# Altium footprint library Connector.PcbLib: 231 footprints (part 5 of 15)
Each footprint in its own frame and in the unit in brackets; x right, y up, seen from the top. Pads: shape width x height; smd on the part's side, far side on the other; paste and mask are expansions set on the pad; w line width, h text height; cw(c..) or ccw(c..) is an arc to the next point about the centre after c.
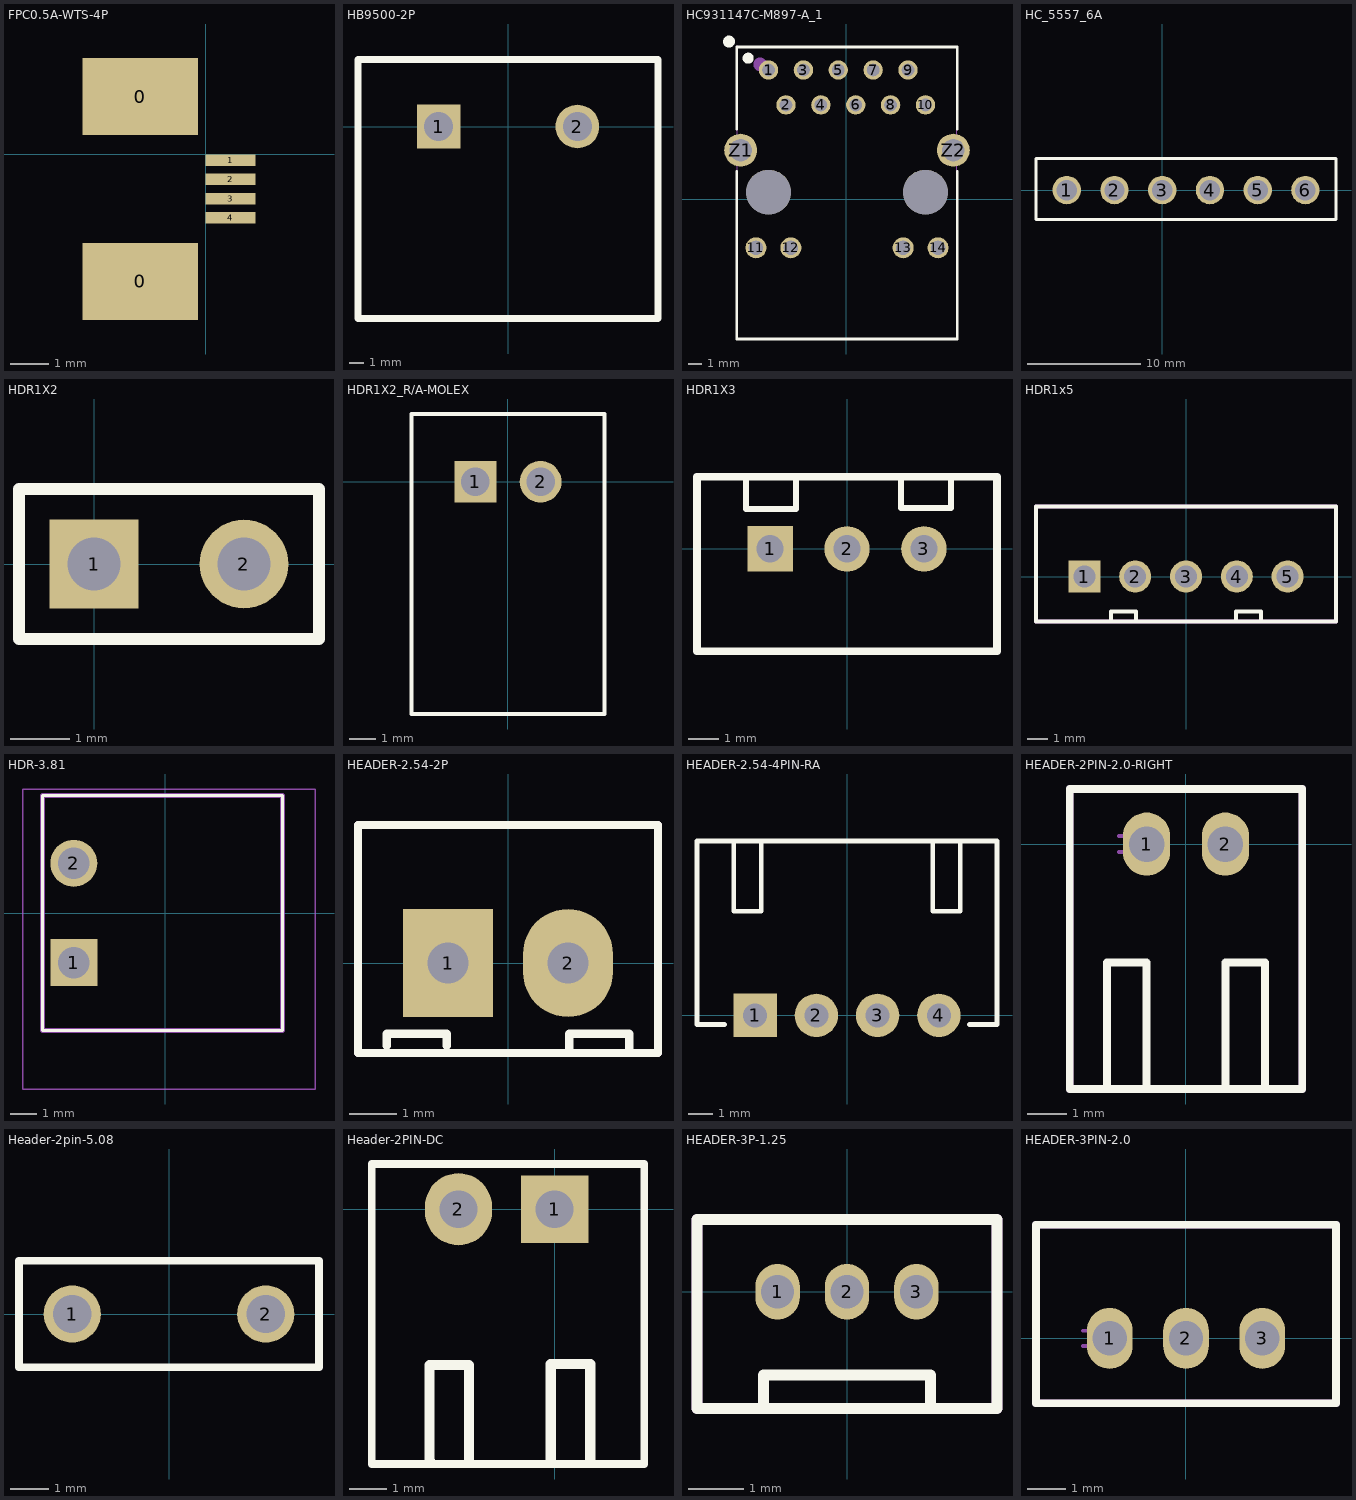
[diagram p4: the footprints below, top view; thin cyan lines are the x and y axes]

## FPC0.5A-WTS-4P [mm]
pads (6):
  rect 3x2 smd: 0(-1.7,-3.3) 0(-1.7,1.5)
  rect 1.3x0.3 smd: 1(0.65,-0.15) 2(0.65,-0.65) 3(0.65,-1.15) 4(0.65,-1.65)

## HB9500-2P [mm] "CONN BARRIER STRIP 2CIRC 0.375\""
pads (2):
  rect 3x3 hole 2: 1(-4.765,0)
  round 3 hole 2: 2(4.765,0)
Top Overlay:
  lines w0.5: -10.3,-13.18 -10.3,4.6 10.3,4.6 10.3,-13.18 -10.3,-13.18
Mechanical 1:
  lines w0.25: -10.3,4.6 10.259,4.6
Mechanical 13:
  lines w0.25: -10.3,4.6 -10.3,4.6 ; -10.3,4.6 -10.3,-13.18 10.3,-13.18 10.3,4.6 10.287,4.587 10.287,4.572 ; -10.3,4.6 10.259,4.6 ; 10.259,4.6 10.287,4.572 ; 10.259,4.6 10.287,4.572
  text ".Designator" at -5,-4 h2
Mechanical 15:
  lines w0.25: -10.3,-13.18 10.3,-13.18 10.3,4.6 -10.3,4.6 -10.3,-13.18
  text ".Comment" at -5,-4 h2
3D body "c-3-1437652-9-p-3d.stp": height 15.91, standoff -5.04, extent -10.3,-13.18 10.3,4.6

## HC931147C-M897-A_1 [mm]
pads (18):
  round 1.408 hole 0.9 slot 0.9 at 0 deg paste+0 mask+0.05: 1(-5.66,9.426) 2(-4.39,6.886) 3(-3.12,9.426) 4(-1.85,6.886) 5(-0.58,9.426) 6(0.69,6.886) 7(1.96,9.426) 8(3.23,6.886) 9(4.5,9.426) 10(5.77,6.886)
  round 1.53 hole 1.02 slot 1.025 at 0 deg paste+0 mask+0.05: 11(-6.575,-3.524) 12(-4.035,-3.524) 13(4.145,-3.524) 14(6.685,-3.524)
  round 2.4 hole 1.6 paste+0 mask+0.05: Z1(-7.69,3.586) Z2(7.8,3.586)
  round 3.25 hole 3.25 unplated: ""(-5.66,0.536) ""(5.77,0.536)
Top Overlay:
  circle w0.5: c-8.539,11.5 r0.186
  lines w0.2: -7.984,2.037 -7.984,-10.16 8.094,-10.16 8.094,2.037 ; -7.984,5.136 -7.984,11.102 8.094,11.102 8.094,5.136
  lines w0.4: -6.945,10.272 cw(c-7.145,10.285) -7.344,10.297 cw(c-7.145,10.285) -6.945,10.276
Mechanical 6:
  circle w0.5: c-6.266,9.837 r0.25
Mechanical 15:
  region: -5.41,9.276 -5.91,9.276 -5.91,9.576 -5.41,9.576
  region: 4.75,9.276 4.25,9.276 4.25,9.576 4.75,9.576
  region: 2.21,9.276 1.71,9.276 1.71,9.576 2.21,9.576
  region: -0.33,9.276 -0.83,9.276 -0.83,9.576 -0.33,9.576
  region: -2.87,9.276 -3.37,9.276 -3.37,9.576 -2.87,9.576
  region: -7.885,11.136 -7.885,11.161 -7.92,11.196 -7.97,11.196 -8.005,11.161 -8.005,11.136 -8.005,11.111 -7.97,11.076 -7.92,11.076 -7.885,11.111
  region: -1.6,6.736 -2.1,6.736 -2.1,7.036 -1.6,7.036
  region: 0.94,6.736 0.44,6.736 0.44,7.036 0.94,7.036
  region: 3.48,6.736 2.98,6.736 2.98,7.036 3.48,7.036
  region: 6.02,6.736 5.52,6.736 5.52,7.036 6.02,7.036
  region: 7.925,4.186 7.925,2.986 7.675,2.986 7.675,4.186
  region: -7.565,4.186 -7.565,2.986 -7.815,2.986 -7.815,4.186
  region: -3.785,-3.774 -4.285,-3.774 -4.285,-3.274 -3.785,-3.274
  region: 4.395,-3.774 3.895,-3.774 3.895,-3.274 4.395,-3.274
  region: -6.325,-3.774 -6.825,-3.774 -6.825,-3.274 -6.325,-3.274
  region: 6.935,-3.774 6.435,-3.774 6.435,-3.274 6.935,-3.274
  region: -4.14,6.736 -4.64,6.736 -4.64,7.036 -4.14,7.036
  lines w0.051: -7.945,-10.164 -7.945,11.136 8.055,11.136 8.055,-10.164 -7.945,-10.164
3D body "step_temp.STEP": height 13.5, standoff -3.05, extent -8.034,-10.364 8.006,10.936

## HC_5557_6A [mm]
pads (6):
  round 2.5 hole 1.8: 1(-8.4,0) 2(-4.2,0) 3(0,0) 4(4.2,0) 5(8.4,0) 6(12.6,0)
Top Overlay:
  lines w0.254: -11.108,-2.606 -11.108,2.794 15.292,2.794 15.292,-2.606 -11.108,-2.606
3D body "3D.step": height 13.2, standoff -3.4, extent -11.244,-3.759 15.156,2.951

## HDR1X2 [mm] "Connector; Header; 2 Position"
pads (2):
  rect 1.5x1.5 hole 0.9: 1(0,0)
  round 1.5 hole 0.9: 2(2.54,0)
Top Overlay:
  lines w0.2: -1.27,-1.27 -1.27,1.27 3.81,1.27 3.81,-1.27 -1.27,-1.27

## HDR1X2_R/A-MOLEX [mm] "Connector; Header; 8x2 Position"
pads (2):
  rect 1.6x1.6 hole 1.1: 1(-1.25,0)
  round 1.6 hole 1.1: 2(1.25,0)
Top Overlay:
  lines w0.15: -3.7,-8.9 -3.7,2.6 3.7,2.6 3.7,-8.9 -3.7,-8.9
3D body "534260210.stp": height 6.85, standoff -3.25, extent -3.7,-8.9 3.7,2.6

## HDR1X3 [mm] "Connector; Header; 3 Position"
pads (3):
  rect 1.5x1.5 hole 0.9: 1(-2.54,0)
  round 1.5 hole 0.9: 2(0,0) 3(2.54,0)
Top Overlay:
  lines w0.2: -3.327,2.375 -3.327,1.321 -1.753,1.321 ; -1.727,1.321 -1.753,1.321 ; -1.676,2.375 -1.676,1.321 -1.753,1.321 ; 1.778,2.375 1.778,1.346 3.353,1.346 ; 3.378,1.346 3.353,1.346 ; 3.429,2.375 3.429,1.346 3.353,1.346
  lines w0.254: -4.95,-3.375 4.95,-3.375 4.95,2.375 -4.95,2.375 -4.95,-3.375
Mechanical 13:
  text ".Designator" at -4.418,-2.7 h2
Mechanical 15:
  text ".Comment" at -4.418,-2.7 h2
3D body "User Library-jst-b3b-xh-a.STEP": height 7, standoff -3.4, extent -4.95,-3.375 4.95,2.375

## HDR1x5 [mm]
pads (5):
  rect 1.6x1.6 hole 1.1: 1(-5.08,0)
  round 1.6 hole 1.1: 2(-2.54,0) 3(0,0) 4(2.54,0) 5(5.08,0)
Top Overlay:
  lines w0.2: -3.75,-2.25 -3.75,-1.75 -2.5,-1.75 -2.5,-2.25 ; 2.5,-2.25 2.5,-1.75 3.75,-1.75 3.75,-2.25 ; -7.5,-2.25 7.5,-2.25 7.5,3.5 -7.5,3.5 -7.5,-2.25
Mechanical 13:
  lines w0.2: -7.5,-2.25 7.5,-2.25 7.5,3.5 -7.5,3.5 -7.5,-2.25
  text ".Designator" at -3.302,-0.635 h1.5
Mechanical 15:
  lines w0.2: -7.5,-2.25 7.5,-2.25 7.5,3.5 -7.5,3.5 -7.5,-2.25
  text ".Comment" at -3.302,-0.381 h1.5
3D body "User Library-XH_5P_2_54W_SHELL.STEP": height 6.7, standoff -0.3, extent -7.45,-2.3 7.45,3.5

## HDR-3.81 [mm]
pads (2):
  rect 1.8x1.8 hole 1.2: 1(-3.5,-1.9)
  round 1.8 hole 1.2: 2(-3.5,1.91)
Top Overlay:
  lines w0.127: -4.7,-4.5 4.5,-4.5 4.5,4.51 -4.7,4.51 -4.7,-4.5
Mechanical 15:
  lines w0.2: -4.7,-4.5 4.5,-4.5 4.5,4.51 -4.7,4.51 -4.7,-4.5
Mechanical 20:
  lines w0.05: -5.45,-6.745 5.75,-6.745 5.75,4.76 -5.45,4.76 -5.45,-6.745
3D body "1803277.stp": height 7.25, standoff -3.4, extent -4.7,-4.5 4.6,4.51

## HEADER-2.54-2P [mil]
pads (2):
  rect 75x90 hole 34: 1(-50,0)
  oval 75x90 hole 34: 2(50,0)
Top Overlay:
  lines w7: -101,-69 -101,-59.06 -51,-59.06 -51,-69 ; 51,-71 51,-59.06 101,-59.06 101,-71 ; -125,-75 125,-75 125,115 -125,115 -125,-75
Mechanical 13:
  lines w7: -125,-75 -125,115 125,115 125,-75 -125,-75
  text ".Designator" at -104.94,-7.87 h78.74
Mechanical 15:
  lines w7: -125,-75 -125,115 125,115 125,-75 -125,-75
  text ".Comment" at -104.94,-7.87 h78.74
3D body "User Library-PCB HEADER (JST BxB-PH-K-S (VERTICAL)).STEP": height 236.22, standoff -75, extent -118.11,-70 118.11,107.17

## HEADER-2.54-4PIN-RA [mm]
height 8
pads (4):
  rect 1.8x1.8 hole 1: 1(-3.81,0)
  round 1.8 hole 1: 2(-1.27,0) 3(1.27,0) 4(3.81,0)
Top Overlay:
  lines w0.2: -5.08,-0.381 -6.223,-0.381 -6.223,7.239 6.223,7.239 6.223,-0.381 5.08,-0.381 ; -4.699,7.239 -4.699,4.318 -3.556,4.318 -3.556,7.239 ; 3.556,7.239 3.556,4.318 4.699,4.318 4.699,7.239
Mechanical 13:
  text ".Designator" at -3.1,2 h1.5
Mechanical 15:
  text ".Comment" at -3.1,2 h1.5
3D body "User Library-XH2_54-4P-R-1.step": height 5.9, standoff -3, extent -6.25,-0.346 6.25,7.254

## HEADER-2PIN-2.0-RIGHT [mm]
pads (2):
  oval 1.2x1.6 hole 0.9: 1(-1,0) 2(1,0)
Top Overlay:
  lines w0.2: -2,-6.2 -2,-3 -1,-3 -1,-6.213 ; 1,-6.213 1,-3 2,-3 2,-6.2 ; -2.95,-6.213 -2.95,1.397 2.95,1.397 2.95,-6.213 -2.95,-6.213
Mechanical 1:
  lines w0.1: -1.7,-0.2 -1.4,-0.2 ccw(c-1,0) -1.4,0.2 -1.7,0.2 ; 1.4,-0.2 cw(c1,0) 1.4,0.2
Mechanical 13:
  lines w0.2: -2.95,-6.213 2.95,-6.213 2.95,1.397 -2.95,1.397 -2.95,-6.213
  text ".Designator" at -0.2,0.5 h1.5
Mechanical 15:
  lines w0.2: -2.95,-6.213 2.95,-6.213 2.95,1.397 -2.95,1.397 -2.95,-6.213
  text ".Comment" at -0.2,0.5 h1.5
3D body "S2B-PH-K-S.STEP": height 5, standoff -3.2, extent -2.921,-6.213 2.979,1.387

## Header-2pin-5.08 [mm]
pads (2):
  round 1.5 hole 1: 1(-2.54,0) 2(2.54,0)
Top Overlay:
  lines w0.2: -3.937,-1.397 -3.937,1.397 -3.556,1.397 3.937,1.397 3.937,-1.397 -3.708,-1.397 -3.937,-1.397
3D body "65779.stp": height 8.57, standoff -2.97, extent -3.81,-1.27 3.81,1.27

## Header-2PIN-DC [mil]
pads (2):
  rect 70x70 hole 39.37: 1(0,0)
  oval 70x75 hole 39.37: 2(-100,0)
Top Overlay:
  lines w7.87: -190,-265 93,-265 93,47 -190,47 -190,-265
  lines w10: -130,-263 cw(c-129,-263) -129,-262 cw(c-129,-261) -130,-261 ; 35,-161 cw(c35,-162) 36,-162
  lines w10.63: -130,-261 -130,-162 -89,-162 -89,-264 ; -4,-263 -4,-161 37,-161 37,-261
3D body "header 2 cong.stp": height 236.7, standoff 0.48, extent -189.96,-250 89.96,50

## HEADER-3P-1.25 [mm]
pads (3):
  oval 0.8x1 hole 0.6: 1(-1.25,0) 2(0,0) 3(1.25,0)
Top Overlay:
  lines w0.2: -1.5,-2.1 -1.5,-1.5 1.5,-1.5 1.5,-2.1 ; -2.7,-2.1 2.7,-2.1 2.7,1.3 -2.7,1.3 -2.7,-2.1
Mechanical 13:
  lines w0.2: -2.7,-2.1 -2.7,1.3 2.7,1.3 2.7,-2.1 -2.7,-2.1
  text ".Designator" at -2.7,-0.8 h1.5
Mechanical 15:
  lines w0.2: -2.7,-2.1 -2.7,1.3 2.7,1.3 2.7,-2.1 -2.7,-2.1
  text ".Comment" at -2.4,-0.8 h1.5
3D body "47568.stp": height 4.27, standoff -2.33, extent -2.7,-2.1 2.7,1.3

## HEADER-3PIN-2.0 [mm]
pads (3):
  oval 1.2x1.6 hole 0.9: 1(-2,0) 2(0,0) 3(2,0)
Top Overlay:
  lines w0.2: -3.93,-1.7 -3.93,2.974 3.93,2.974 3.93,-1.7 -3.93,-1.7
Mechanical 1:
  lines w0.1: -2.7,-0.2 -2.4,-0.2 ccw(c-2,0) -2.4,0.2 -2.7,0.2 ; 0.4,-0.2 cw(c0,0) 0.4,0.2
Mechanical 13:
  lines w0.2: -3.93,-1.7 -3.93,2.974 3.93,2.974 3.93,-1.7 -3.93,-1.7
  text ".Designator" at -3.075,0.4 h1.5
Mechanical 15:
  lines w0.2: -3.93,-1.7 -3.93,2.974 3.93,2.974 3.93,-1.7 -3.93,-1.7
  text ".Comment" at -2.581,0.35 h1.5
3D body "JST - PH - Thru (V) - 3Pin - 2.00mm.stp": height 5.89, standoff -3.05, extent -3.93,-1.7 3.93,2.974